# Altium footprint library Connectors.PcbLib: 67 footprints (part 4 of 5)
Each footprint in its own frame and in the unit in brackets; x right, y up, seen from the top. Pads: shape width x height; smd on the part's side, far side on the other; paste and mask are expansions set on the pad; w line width, h text height; cw(c..) or ccw(c..) is an arc to the next point about the centre after c.
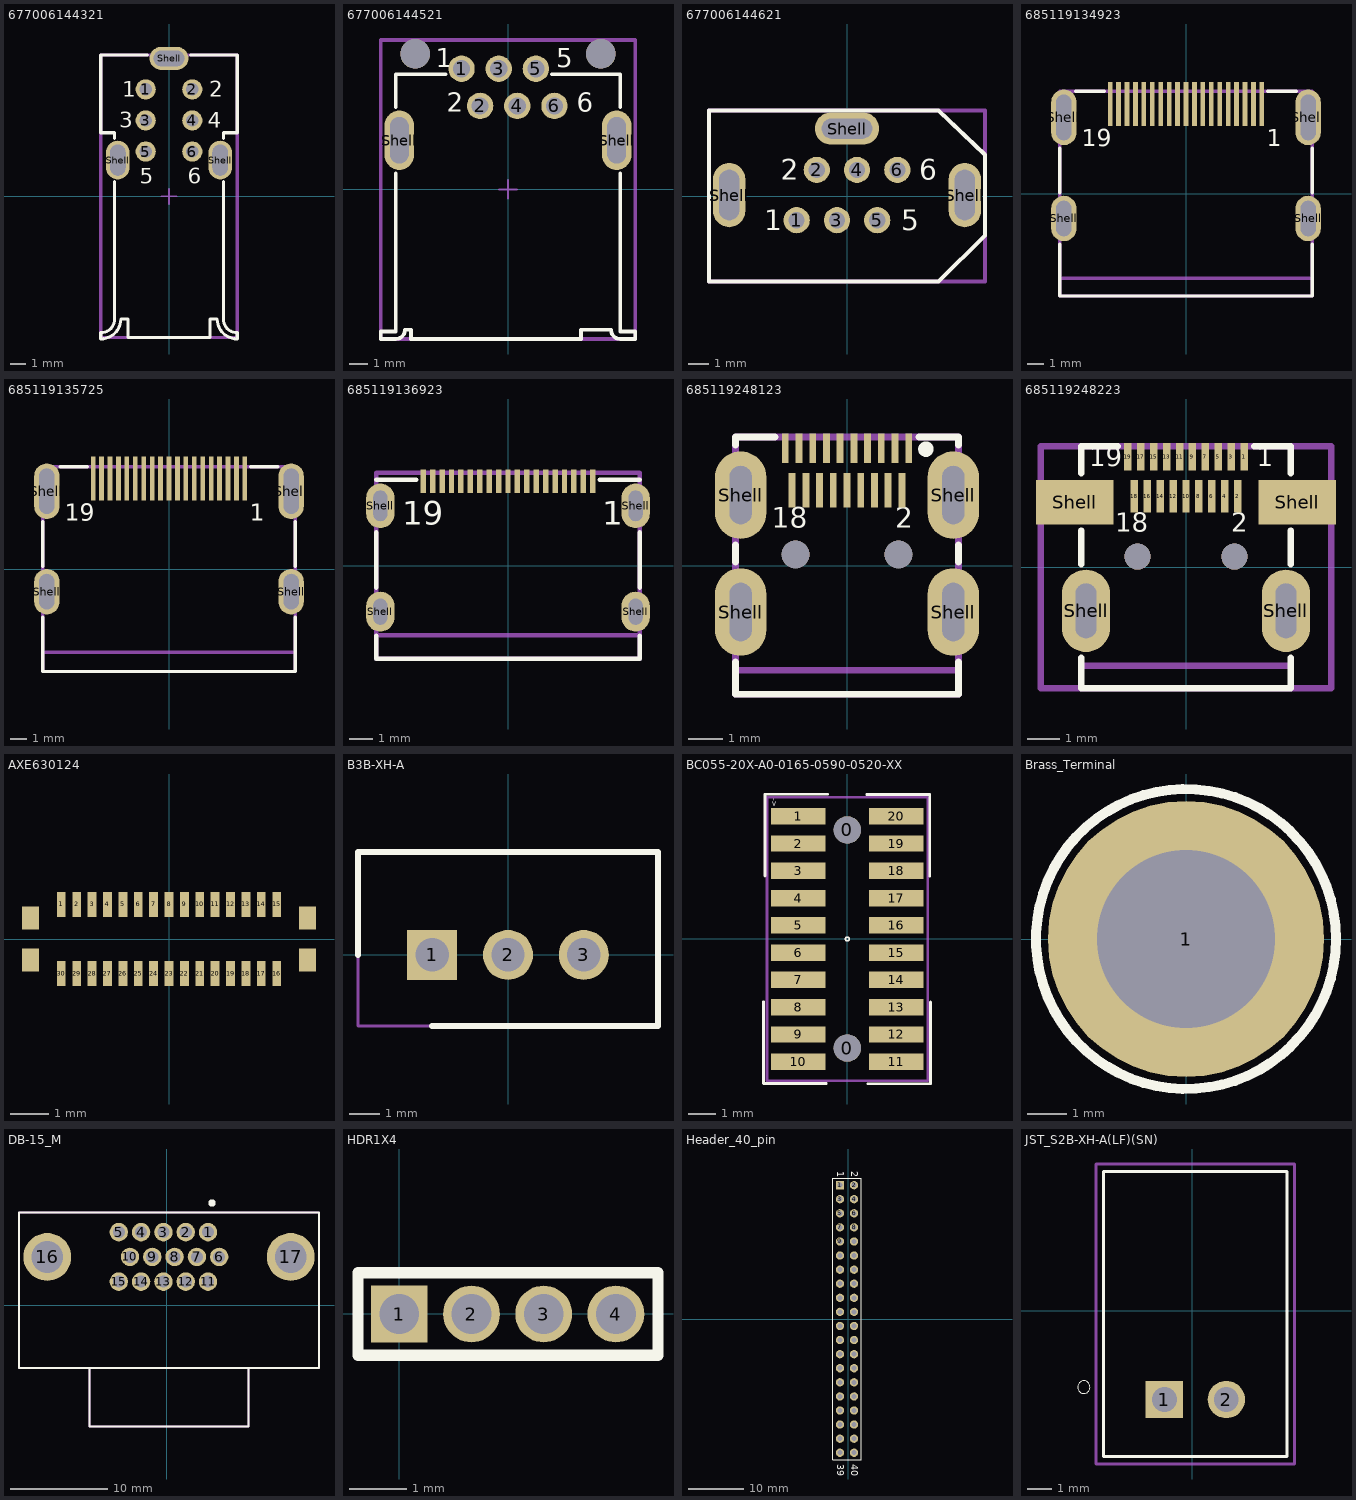
[diagram p3: the footprints below, top view; thin cyan lines are the x and y axes]

## 677006144321 [mm] "IEEE 1394 Up Right Receptacle WR-COM"
height 14
pads (9):
  round 1.3 hole 0.8: 1(-1.5,6.89) 2(1.5,6.89) 3(-1.5,4.89) 4(1.5,4.89) 5(-1.5,2.89) 6(1.5,2.89)
  oval 1.5x2.5 hole 1 slot 2 at 90 deg: Shell(-3.3,2.34) Shell(3.3,2.34)
  oval 2.5x1.5 hole 1 slot 2 at 0 deg: Shell(0,8.89)
Top Overlay:
  lines w0.2: -3.5,0.94 -3.5,-7.89 cw(c-4.4,-7.89) -4.4,-8.79 -4.4,-9.19 ccw(c-4.4,-7.89) -3.1,-7.89 -2.65,-7.89 -2.65,-9.1 2.65,-9.1 2.65,-7.89 3.1,-7.89 ccw(c4.4,-7.89) 4.4,-9.19 4.4,-8.79 cw(c4.4,-7.89) 3.5,-7.89 3.5,0.94 ; -3.5,3.74 -3.5,4.1 -4.4,4.1 -4.4,9.1 -1.4,9.1 ; 1.4,9.1 4.4,9.1 4.4,4.1 3.5,4.1 3.5,3.74
  text "1" at -3,6.415 h1.02
  text "2" at 2.6,6.415 h1.02
  text "3" at -3.2,4.415 h1.02
  text "4" at 2.5,4.415 h1.02
  text "5" at -1.9,0.815 h1.02
  text "6" at 1.2,0.815 h1.02
Mechanical 13:
  lines w0.2: -4.4,-9.1 -4.4,9.1 4.4,9.1 4.4,-9.1 -4.4,-9.1
Mechanical 15:
  lines w0.1: -0.5,0 0.5,0 ; 0,-0.5 0,0.5
3D body "677006144321.stp": height 13.4, standoff -3.24, extent -4.4,-9.1 4.4,9.1

## 677006144521 [mm] "IEEE 1394 Horizontal Receptacle WR-COM"
height 7.95
pads (10):
  round 1.42 hole 0.92: 1(-2.5,6.5) 2(-1.5,4.5) 3(-0.5,6.5) 4(0.5,4.5) 5(1.5,6.5) 6(2.5,4.5)
  oval 1.6x3.2 hole 1 slot 2.5 at 90 deg: Shell(-5.85,2.65) Shell(5.85,2.65)
  round 1.6 hole 1.6 unplated: ""(-5,7.3) ""(5,7.3)
Top Overlay:
  lines w0.2: -6.05,0.88 -6.05,-7.65 -6.85,-7.65 -6.85,-8.05 -6.039,-8.05 ; -6.05,4.43 -6.05,6.2 -3.36,6.2 ; -6.039,-8.05 ccw(c-6.039,-7.561) -5.55,-7.549 -5.22,-7.55 -5.22,-8.05 3.93,-8.05 3.93,-7.55 5.55,-7.55 ; 2.36,6.2 6.05,6.2 6.05,4.43 ; 5.55,-7.549 ccw(c6.039,-7.561) 6.039,-8.05 ; 6.039,-8.05 6.85,-8.05 6.85,-7.65 6.05,-7.65 6.05,0.88
  text "1" at -3.9,6.575 h1.02
  text "5" at 2.6,6.575 h1.02
  text "2" at -3.3,4.175 h1.02
  text "6" at 3.7,4.175 h1.02
Mechanical 13:
  lines w0.2: -6.85,-8.05 -6.85,8.05 6.85,8.05 6.85,-8.05 -6.85,-8.05
Mechanical 15:
  lines w0.1: -0.5,0 0.5,0 ; 0,-0.5 0,0.5
3D body "677006144521.stp": height 8.8, standoff -3.3, extent -6.85,-8.05 6.85,8.05

## 677006144621 [mm] "IEEE 1394 Vertical Receptacle"
height 14.8
pads (9):
  round 1.3 hole 0.8: 1(-2.5,-1.2) 2(-1.5,1.3) 3(-0.5,-1.2) 4(0.5,1.3) 5(1.5,-1.2) 6(2.5,1.3)
  oval 1.6x3.2 hole 1 slot 2.5 at 90 deg: Shell(-5.85,0.05) Shell(5.85,0.05)
  oval 3.2x1.6 hole 1 slot 2.5 at 0 deg: Shell(0,3.35)
Top Overlay:
  lines w0.2: -6.85,-4.25 -6.85,4.25 4.55,4.25 6.85,2.05 6.85,-1.95 4.55,-4.25 -6.85,-4.25
  text "1" at -4.1,-1.7 h1.02
  text "2" at -3.3,0.8 h1.02
  text "5" at 2.7,-1.7 h1.02
  text "6" at 3.6,0.8 h1.02
Mechanical 13:
  lines w0.2: -6.85,-4.25 6.85,-4.25 6.85,4.25 -6.85,4.25 -6.85,-4.25
3D body "677006144621.stp": height 14.8, standoff -3.45, extent -6.85,-4.2 6.85,4.3

## 685119134923 [mm] "HDMI SMT Horizontal"
height 6.13
pads (23):
  rect 0.28x2.6 smd: 1(4.5,5.325) 2(4,5.325) 3(3.5,5.325) 4(3,5.325) 5(2.5,5.325) 6(2,5.325) 7(1.5,5.325) 8(1,5.325) 9(0.5,5.325) 10(0,5.325) 11(-0.5,5.325) 12(-1,5.325) 13(-1.5,5.325) 14(-2,5.325) 15(-2.5,5.325) 16(-3,5.325) 17(-3.5,5.325) 18(-4,5.325) 19(-4.5,5.325)
  oval 1.5x2.7 hole 0.9 slot 2.1 at 90 deg: Shell(-7.25,-1.475) Shell(7.25,-1.475)
  oval 1.5x3.3 hole 0.9 slot 2.7 at 90 deg: Shell(-7.25,4.525) Shell(7.25,4.525)
Top Overlay:
  lines w0.2: -7.5,-2.985 -7.5,-6.075 7.5,-6.075 7.5,-2.985 ; -7.5,0.035 -7.5,2.705 ; -6.55,6.075 -4.84,6.075 ; 4.84,6.075 6.55,6.075 ; 7.5,0.035 7.5,2.705
  text "1" at 4.8,2.8 h1.02
  text "19" at -6.2,2.8 h1.02
Mechanical 13:
  lines w0.2: -7.5,-6.075 -7.5,6.075 7.5,6.075 7.5,-6.075 -7.5,-6.075
Mechanical 15:
  lines w0.2: -7.5,-5.025 7.5,-5.025
  text "PCB Edge" at -1.794,-4.721 h1
3D body "685119134923.stp": height 6.17, standoff -2.21, extent -7.5,-6.075 7.5,6.075

## 685119135725 [mm] "HDMI SMT Horizontal with M3 screw"
height 16.05
pads (23):
  rect 0.28x2.6 smd: 1(4.5,5.385) 2(4,5.385) 3(3.5,5.385) 4(3,5.385) 5(2.5,5.385) 6(2,5.385) 7(1.5,5.385) 8(1,5.385) 9(0.5,5.385) 10(0,5.385) 11(-0.5,5.385) 12(-1,5.385) 13(-1.5,5.385) 14(-2,5.385) 15(-2.5,5.385) 16(-3,5.385) 17(-3.5,5.385) 18(-4,5.385) 19(-4.5,5.385)
  oval 1.5x2.7 hole 0.9 slot 2.1 at 90 deg: Shell(-7.25,-1.335) Shell(7.25,-1.335)
  oval 1.5x3.3 hole 0.9 slot 2.7 at 90 deg: Shell(-7.25,4.625) Shell(7.25,4.625)
Top Overlay:
  lines w0.2: -7.5,-2.845 -7.5,-6.075 7.5,-6.075 7.5,-2.845 ; -7.5,0.175 -7.5,2.815 ; -6.47,6.075 -4.84,6.075 ; 4.84,6.075 6.47,6.075 ; 7.5,0.175 7.5,2.815
  text "19" at -6.2,2.86 h1.02
  text "1" at 4.8,2.86 h1.02
Mechanical 13:
  lines w0.2: -7.5,-6.075 -7.5,6.075 7.5,6.075 7.5,-6.075 -7.5,-6.075
Mechanical 15:
  lines w0.2: -7.5,-4.925 7.5,-4.925
  text "PCB Edge" at -1.794,-4.621 h1
3D body "685119135725.stp": height 16.1, standoff -2.15, extent -7.5,-6.075 7.5,6.075

## 685119136923 [mm] "Mini HDMI SMT Horizontal"
height 3.3
pads (23):
  rect 0.23x1 smd: 1(3.6,3.6) 2(3.2,3.6) 3(2.8,3.6) 4(2.4,3.6) 5(2,3.6) 6(1.6,3.6) 7(1.2,3.6) 8(0.8,3.6) 9(0.4,3.6) 10(0,3.6) 11(-0.4,3.6) 12(-0.8,3.6) 13(-1.2,3.6) 14(-1.6,3.6) 15(-2,3.6) 16(-2.4,3.6) 17(-2.8,3.6) 18(-3.2,3.6) 19(-3.6,3.6)
  oval 1.2x1.7 hole 0.6 slot 1.1 at 90 deg: Shell(-5.425,-1.95) Shell(5.425,-1.95)
  oval 1.2x1.9 hole 0.6 slot 1.3 at 90 deg: Shell(-5.425,2.55) Shell(5.425,2.55)
Top Overlay:
  lines w0.2: -5.6,-2.98 -5.6,-3.95 5.6,-3.95 5.6,-2.98 ; -5.6,-0.92 -5.6,1.42 ; -5.6,3.65 -3.9,3.65 ; 3.9,3.65 5.6,3.65 ; 5.6,-0.92 5.6,1.42
  text "19" at -4.5,1.75 h1.02
  text "1" at 4,1.75 h1.02
Mechanical 13:
  lines w0.2: -5.6,-3.95 5.6,-3.95 5.6,3.95 -5.6,3.95 -5.6,-3.95
Mechanical 15:
  lines w0.2: -5.6,-2.95 5.6,-2.95
  text "PCB Edge" at -1.794,-2.646 h0.89
3D body "685119136923.stp": height 3.29, standoff -2.16, extent -5.625,-3.95 5.625,3.952

## 685119248123 [mm] "Micro HDMI Horizontal SMT"
height 3
pads (25):
  rect 0.2x0.85 smd: 1(1.8,3.425) 3(1.4,3.425) 5(1,3.425) 7(0.6,3.425) 9(0.2,3.425) 11(-0.2,3.425) 13(-0.6,3.425) 15(-1,3.425) 17(-1.4,3.425) 19(-1.8,3.425)
  rect 0.2x1 smd: 2(1.6,2.2) 4(1.2,2.2) 6(0.8,2.2) 8(0.4,2.2) 10(0,2.2) 12(-0.4,2.2) 14(-0.8,2.2) 16(-1.2,2.2) 18(-1.6,2.2)
  oval 1.5x2.55 hole 0.65 slot 1.7 at 90 deg: Shell(-3.1,-1.35) Shell(-3.1,2.06) Shell(3.1,-1.35) Shell(3.1,2.06)
  round 0.81 hole 0.81 unplated: ""(-1.5,0.33) ""(1.5,0.33)
Top Overlay:
  circle w0.25: c2.3,3.4 r0.1
  lines w0.2: -3.25,-2.81 -3.25,-3.75 3.25,-3.75 3.25,-2.81 ; -3.25,0.11 -3.25,0.6 ; -3.25,3.52 -3.25,3.75 -2.1,3.75 ; 2.1,3.75 3.25,3.75 3.25,3.52 ; 3.25,0.11 3.25,0.6
  text "2" at 1.4,0.9 h1.02
  text "18" at -2.2,0.9 h1.02
Mechanical 13:
  lines w0.2: -3.25,-3.75 3.25,-3.75 3.25,3.75 -3.25,3.75 -3.25,-3.75
Mechanical 15:
  lines w0.2: -3.25,-3.05 3.25,-3.05
  text "PCB Edge" at -1.794,-2.746 h0.89
3D body "685119248123.stp": height 2.99, standoff -1.11, extent -3.25,-3.75 3.25,3.755

## 685119248223 [mm] "Micro HDMI Horizontal SMT Hybrid Mount"
height 3
pads (25):
  rect 0.23x0.85 smd: 1(1.8,3.425) 3(1.4,3.425) 5(1,3.425) 7(0.6,3.425) 9(0.2,3.425) 11(-0.2,3.425) 13(-0.6,3.425) 15(-1,3.425) 17(-1.4,3.425) 19(-1.8,3.425)
  rect 0.23x1 smd: 2(1.6,2.2) 4(1.2,2.2) 6(0.8,2.2) 8(0.4,2.2) 10(0,2.2) 12(-0.4,2.2) 14(-0.8,2.2) 16(-1.2,2.2) 18(-1.6,2.2)
  rect 2.4x1.38 smd: Shell(-3.45,2.02) Shell(3.45,2.02)
  oval 1.5x2.55 hole 0.65 slot 1.7 at 90 deg: Shell(-3.1,-1.35) Shell(3.1,-1.35)
  round 0.81 hole 0.81 unplated: ""(-1.5,0.33) ""(1.5,0.33)
Top Overlay:
  lines w0.2: -3.25,-2.81 -3.25,-3.75 3.25,-3.75 3.25,-2.81 ; -3.25,0.1 -3.25,1.14 ; -3.25,2.91 -3.25,3.75 -2.12,3.75 ; 2.12,3.75 3.25,3.75 3.25,2.91 ; 3.25,0.1 3.25,1.14
  text "1" at 2.2,2.938 h1.02
  text "19" at -3,2.938 h1.02
  text "18" at -2.2,0.9 h1.02
  text "2" at 1.4,0.9 h1.02
Mechanical 13:
  lines w0.2: -4.509,-3.75 -4.509,3.75 4.509,3.75 4.509,-3.75 -4.509,-3.75
Mechanical 15:
  lines w0.2: -3.25,-3.05 3.25,-3.05
  text "PCB Edge" at -1.794,-2.746 h0.89
3D body "685119248223.stp": height 2.99, standoff -1.11, extent -4.509,-3.75 4.509,3.755

## AXE630124 [mm]
pads (34):
  rect 0.23x0.65 smd mask+0.05: 1(-2.8,0.9) 2(-2.4,0.9) 3(-2,0.9) 4(-1.6,0.9) 5(-1.2,0.9) 6(-0.8,0.9) 7(-0.4,0.9) 8(0,0.9) 9(0.4,0.9) 10(0.8,0.9) 11(1.2,0.9) 12(1.6,0.9) 13(2,0.9) 14(2.4,0.9) 15(2.8,0.9) 16(2.8,-0.9) 17(2.4,-0.9) 18(2,-0.9) 19(1.6,-0.9) 20(1.2,-0.9) 21(0.8,-0.9) 22(0.4,-0.9) 23(0,-0.9) 24(-0.4,-0.9) 25(-0.8,-0.9) 26(-1.2,-0.9) 27(-1.6,-0.9) 28(-2,-0.9) 29(-2.4,-0.9) 30(-2.8,-0.9)
  rect 0.45x0.6 smd mask+0.05: ""(-3.6,-0.55) ""(-3.6,0.55) ""(3.6,-0.55) ""(3.6,0.55)
3D body "axe630124.stp": height 0.65, standoff 0, extent -3.9,-1 3.9,1

## B3B-XH-A [mm]
pads (3):
  rect 1.65x1.65 / inner round 1.65 / far side rect 1.65x1.65 hole 1.1: 1(-2.5,0)
  round 1.65 hole 1.1: 2(0,0) 3(2.5,0)
Top Overlay:
  lines w0.2: -4.95,0 -4.95,3.4 4.95,3.4 4.95,-2.35 -2.5,-2.35
Mechanical 15:
  lines w0.1: -4.95,-2.35 4.95,-2.35 4.95,3.4 -4.95,3.4 -4.95,-2.35

## BC055-20X-A0-0165-0590-0520-XX [mm]
pads (22):
  round 1 hole 1: 0(0.001,-4) 0(0.001,4)
  rect 2x0.6 smd: 1(-1.799,4.5) 2(-1.799,3.5) 3(-1.799,2.5) 4(-1.799,1.5) 5(-1.799,0.5) 6(-1.799,-0.5) 7(-1.799,-1.5) 8(-1.799,-2.5) 9(-1.799,-3.5) 10(-1.799,-4.5) 11(1.801,-4.5) 12(1.801,-3.5) 13(1.801,-2.5) 14(1.801,-1.5) 15(1.801,-0.5) 16(1.801,0.5) 17(1.801,1.5) 18(1.801,2.5) 19(1.801,3.5) 20(1.801,4.5)
Top Overlay:
  circle w0.05: c0,0 r0.072
  lines w0.1: -3.073,-2.3 -3.073,-5.3 -0.773,-5.3 ; -3.023,2.309 -3.023,5.309 -0.723,5.309 ; 0.711,5.3 3.011,5.3 ; 0.748,-5.309 3.048,-5.309 3.048,-2.309 ; 3.023,2.3 3.023,5.3
  text "->" at -2.769,5.156 h0.2
Mechanical 3:
  lines w0.1: -2.949,-5.2 2.951,-5.2 2.951,5.2 -2.949,5.2 -2.949,-5.2
3D body "BC055-20X-A0-0165-0590-0520-XX_revE.STEP": height 7.55, standoff 0, extent -2.599,-5.1 2.601,5.1

## Brass_Terminal [mm]
pads (1):
  round 7 hole 4.5: 1(0,0)
Top Overlay:
  circle w0.254: c0,0 r3.8
3D body "Brass_Terminal.STEP": height 8, standoff -1.5, extent -2.525,-3.485 2.475,2.515

## DB-15_M [mm]
pads (17):
  round 1.89 hole 1.24: 1(4.25,7.501) 2(1.96,7.501) 3(-0.33,7.501) 4(-2.62,7.501) 5(-4.909,7.501) 6(5.395,4.961) 7(3.106,4.961) 8(0.816,4.961) 9(-1.475,4.961) 10(-3.765,4.961) 11(4.25,2.421) 12(1.96,2.421) 13(-0.33,2.421) 14(-2.62,2.421) 15(-4.909,2.421)
  round 4.91 hole 3.26: 16(-12.252,4.961) 17(12.738,4.961)
Top Overlay:
  circle w0.4: c4.667,10.49 r0.174
  lines w0.2: -7.907,-6.469 -7.907,-12.469 8.393,-12.469 8.393,-6.469 ; -15.157,-6.469 -15.157,9.531 15.643,9.531 15.643,-6.469 -15.157,-6.469
Mechanical 15:
  lines w0.2: -7.907,-6.469 -7.907,-12.469 8.393,-12.469 8.393,-6.469 ; -15.157,-6.469 15.643,-6.469 15.643,9.531 -15.157,9.531 -15.157,-6.469

## HDR1X4 [mm] "Connector; Header; 4 Position"
pads (4):
  rect 1x1 hole 0.7: 1(0,0)
  round 1 hole 0.7: 2(1.27,0) 3(2.54,0) 4(3.81,0)
Top Overlay:
  lines w0.2: -0.725,-0.725 -0.725,0.725 4.55,0.725 4.55,-0.725 -0.725,-0.725

## Header_40_pin [mm]
pads (40):
  rect 1.5x1.5 hole 0.9: 1(-1.54,24.22)
  round 1.5 hole 0.9: 2(1,24.22) 3(-1.54,21.68) 4(1,21.68) 5(-1.54,19.14) 6(1,19.14) 7(-1.54,16.6) 8(1,16.6) 9(-1.54,14.06) 10(1,14.06) 11(-1.54,11.52) 12(1,11.52) 13(-1.54,8.98) 14(1,8.98) 15(-1.54,6.44) 16(1,6.44) 17(-1.54,3.9) 18(1,3.9) 19(-1.54,1.36) 20(1,1.36) 21(-1.54,-1.18) 22(1,-1.18) 23(-1.54,-3.72) 24(1,-3.72) 25(-1.54,-6.26) 26(1,-6.26) 27(-1.54,-8.8) 28(1,-8.8) 29(-1.54,-11.34) 30(1,-11.34) 31(-1.54,-13.88) 32(1,-13.88) 33(-1.54,-16.42) 34(1,-16.42) 35(-1.54,-18.96) 36(1,-18.96) 37(-1.54,-21.5) 38(1,-21.5) 39(-1.54,-24.04) 40(1,-24.04)
Top Overlay:
  lines w0.2: -2.81,-25.31 2.27,-25.31 2.27,25.49 -2.81,25.49 -2.81,-25.31
  text "39" at -2.048,-26.072 h1.27
  text "40" at 0.492,-26.072 h1.27
  text "2" at 0.492,26.76 h1.27
  text "1" at -2.048,26.76 h1.27

## JST_S2B-XH-A(LF)(SN) [mm]
pads (2):
  rect 1.508x1.508 hole 1: 1(-1.133,-3.586)
  round 1.508 hole 1: 2(1.367,-3.586)
Top Overlay:
  circle w0: c-4.383,-3.086 r0.254
  lines w0.127: -3.583,-5.886 -3.583,5.614 3.817,5.614 3.817,-5.886 -3.583,-5.886
Mechanical 1:
  lines w0.127: -3.883,-6.186 -3.883,5.914 4.117,5.914 4.117,-6.186 -3.883,-6.186